# Altium footprint library Project_Vega.PcbLib: 57 footprints (part 3 of 4)
Each footprint in its own frame and in the unit in brackets; x right, y up, seen from the top. Pads: shape width x height; smd on the part's side, far side on the other; paste and mask are expansions set on the pad; w line width, h text height; cw(c..) or ccw(c..) is an arc to the next point about the centre after c.
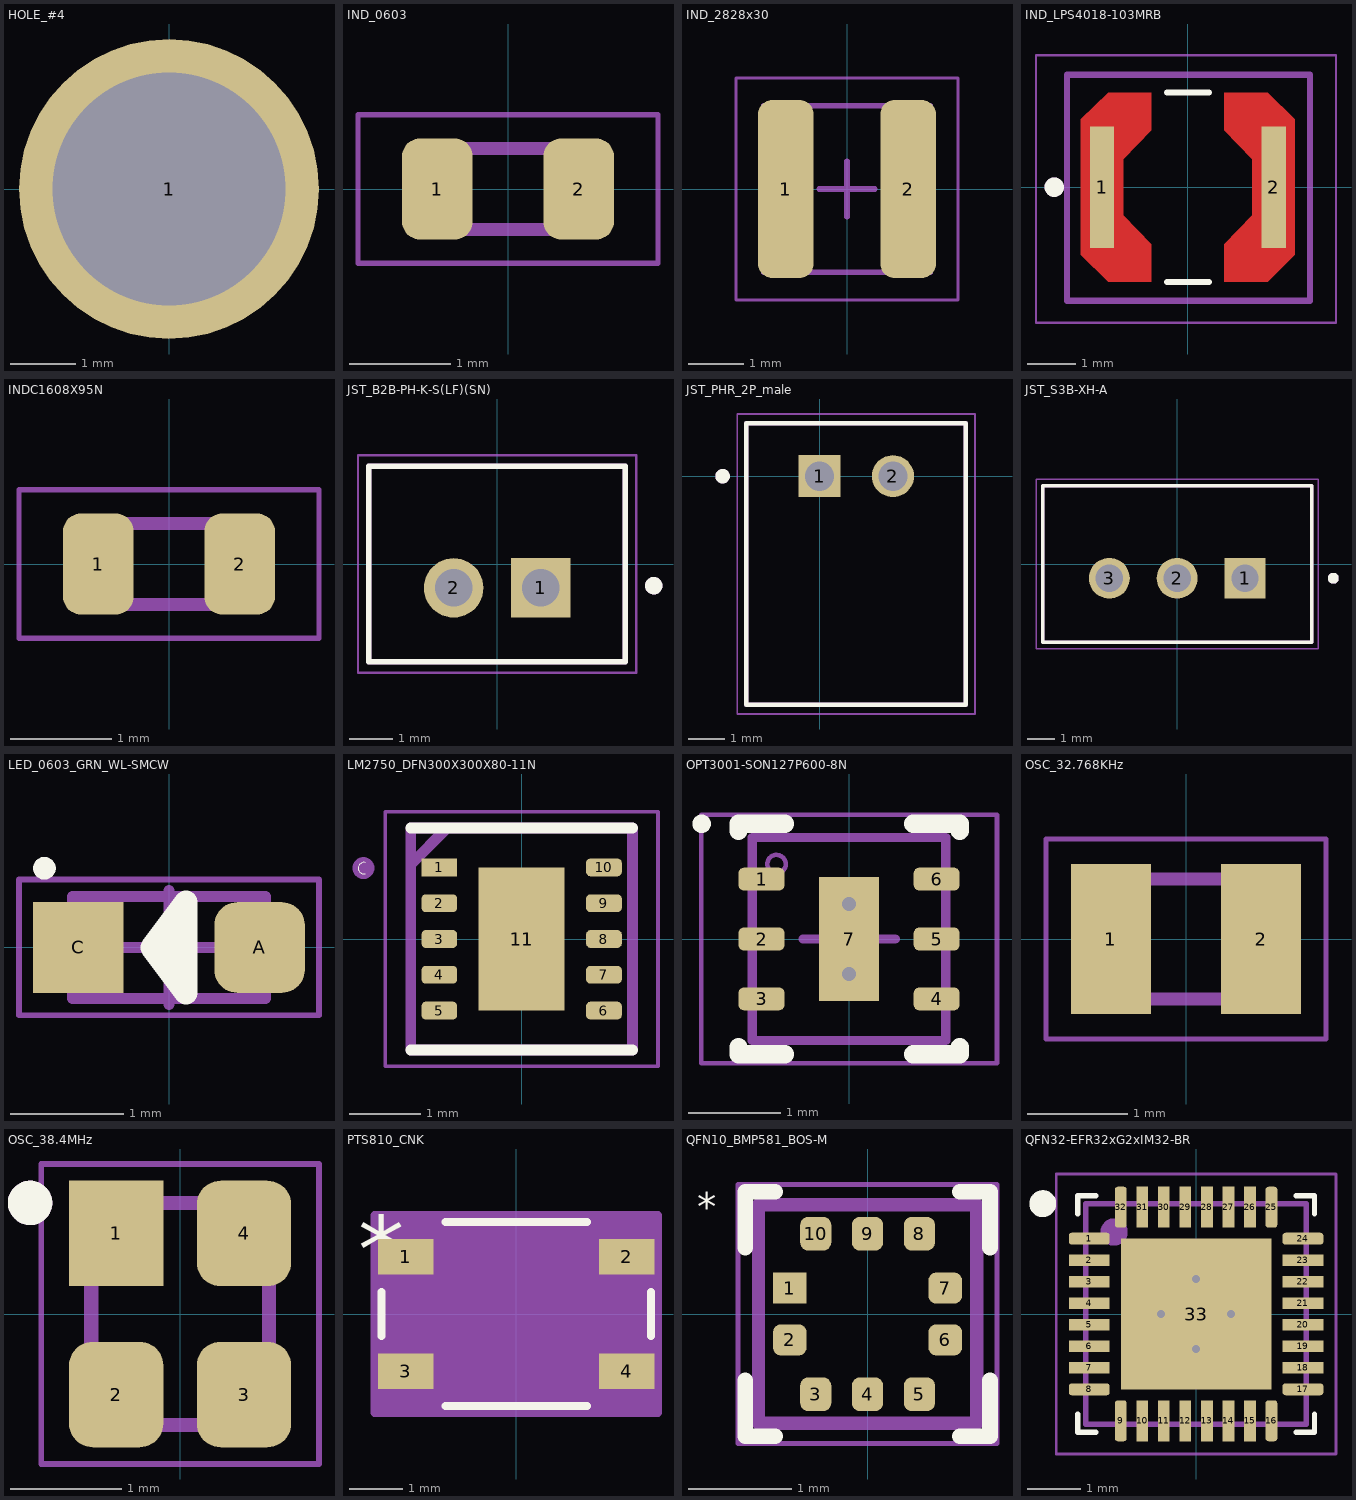
[diagram p2: the footprints below, top view; thin cyan lines are the x and y axes]

## HOLE_#4 [mil]
pads (1):
  round 180 hole 140: 1(0,0)

## IND_0603 [mm] "Inductor Package 0603"
pads (2):
  rrect50% 0.7x1 smd: 1(-0.7,0) 2(0.7,0)
Mechanical 13:
  lines w0.127: -0.8,-0.4 0.8,-0.4 0.8,0.4 -0.8,0.4 -0.8,-0.4
  text ".Designator" at -0.152,-0.339 h0.51
Mechanical 15:
  lines w0.05: -1.485,-0.735 -1.485,0.735 1.485,0.735 1.485,-0.735 -1.485,-0.735
3D body "step_temp.STEP": height 0.95, standoff 0, extent -0.8,-0.4 0.8,0.4

## IND_2828x30 [mm] "Precision Wire Wound Inductor, 2-Leads, Body 2.80x2.80mm, IPC Medium Density"
height 3
pads (2):
  rrect50% 1x3.2 smd: 1(-1.1,0) 2(1.1,0)
Mechanical 13:
  lines w0.1: -1.5,-1.5 1.5,-1.5 1.5,1.5 -1.5,1.5 -1.5,-1.5
  text ".Designator" at -1.12,-1.02 h0.9
Mechanical 15:
  lines w0.05: -2,-2 -2,2 2,2 2,-2 -2,-2
  lines w0.1: -0.5,0 0.5,0 ; 0,-0.5 0,0.5
3D body "744025001_Download_STP_WE-TPC-2828_rev1.stp": height 2.8, standoff 0, extent -1.4,-1.4 1.4,1.4

## IND_LPS4018-103MRB [mm]
height 1.8
pads (2):
  rect 0.5x2.5 smd paste-2 mask+0: 1(-1.765,0) 2(1.765,0)
Top Layer:
  region: -0.75,1.17 -1.33,0.575 -1.33,-0.575 -0.75,-1.17 -0.75,-1.945 -1.64,-1.945 -2.2,-1.395 -2.2,1.395 -1.64,1.945 -0.75,1.945
  region: 2.2,1.395 2.2,-1.395 1.64,-1.945 0.75,-1.945 0.75,-1.17 1.33,-0.575 1.33,0.575 0.75,1.17 0.75,1.945 1.64,1.945
Top Overlay:
  circle w0.2: c-2.75,0 r0.1
  lines w0.127: -0.43,-1.95 0.43,-1.95 ; -0.43,1.95 0.43,1.95
Top Paste:
  region: -0.75,1.17 -1.33,0.575 -1.33,-0.575 -0.75,-1.17 -0.75,-1.945 -1.64,-1.945 -2.2,-1.395 -2.2,1.395 -1.64,1.945 -0.75,1.945
  region: 2.2,1.395 2.2,-1.395 1.64,-1.945 0.75,-1.945 0.75,-1.17 1.33,-0.575 1.33,0.575 0.75,1.17 0.75,1.945 1.64,1.945
Top Solder:
  region: -0.65,1.129 -1.23,0.534 -1.23,-0.534 -0.65,-1.129 -0.65,-2.045 -1.681,-2.045 -2.3,-1.437 -2.3,1.437 -1.681,2.045 -0.65,2.045
  region: 2.3,1.437 2.3,-1.437 1.681,-2.045 0.65,-2.045 0.65,-1.129 1.23,-0.534 1.23,0.534 0.65,1.129 0.65,2.045 1.681,2.045
Mechanical 13:
  circle w0.2: c-2.75,0 r0.1
  lines w0.127: -2.489,-2.337 2.515,-2.337 2.515,2.311 -2.489,2.311 -2.489,-2.337
  text ".Designator" at -0.279,-0.347 h1.02
Mechanical 15:
  lines w0.05: -3.124,-2.794 3.048,-2.794 3.048,2.718 -3.124,2.718 -3.124,-2.794
3D body "LPS4018-103MRC.stp": height 1.81, standoff 0, extent -1.99,-2.032 1.99,1.948

## INDC1608X95N [mm]
pads (2):
  rrect50% 0.7x1 smd: 1(-0.7,0) 2(0.7,0)
Mechanical 13:
  lines w0.127: -0.8,-0.4 -0.8,0.4 0.8,0.4 0.8,-0.4 -0.8,-0.4
  text ".Designator" at -0.584,-0.119 h0.25
Mechanical 15:
  lines w0.05: -1.485,-0.735 1.485,-0.735 1.485,0.735 -1.485,0.735 -1.485,-0.735
3D body "step_temp.STEP": height 0.95, standoff 0, extent -0.8,-0.4 0.8,0.4

## JST_B2B-PH-K-S(LF)(SN) [mm]
pads (2):
  rect 1.368x1.368 / inner round 1.368 / far side rect 1.368x1.368 hole 0.86: 1(1,-0.55)
  round 1.368 hole 0.86: 2(-1,-0.55)
Top Overlay:
  circle w0.2: c3.6,-0.5 r0.1
  lines w0.127: -2.95,-2.25 -2.95,2.25 2.95,2.25 2.95,-2.25 -2.95,-2.25
Mechanical 1:
  text ".Designator" at -2.433,1.066 h0.5
Mechanical 13:
  circle w0.2: c3.6,-0.5 r0.1
  lines w0.127: -2.95,-2.25 2.95,-2.25 2.95,2.25 -2.95,2.25 -2.95,-2.25
Mechanical 15:
  lines w0.05: -3.2,-2.5 3.2,-2.5 3.2,2.5 -3.2,2.5 -3.2,-2.5
3D body "B2B-PH-K-S(LF)(SN)--3DModel-STEP-56544.STEP": height 6.05, standoff -3.35, extent -2.95,-2.25 2.95,2.25

## JST_PHR_2P_male [mm]
height 5.25
pads (2):
  rect 1.15x1.15 / inner round 1.15 / far side rect 1.15x1.15 hole 0.8: 1(0,0)
  round 1.15 hole 0.8: 2(2.007,0)
Top Overlay:
  circle w0.2: c-2.65,0 r0.1
  lines w0.127: -2,-6.25 -2,1.45 4,1.45 4,-6.25 -2,-6.25
Mechanical 13:
  circle w0.2: c-2.65,0 r0.1
  lines w0.127: -2,-6.25 -2,1.45 4,1.45 4,-6.25 -2,-6.25
  text ".Designator" at 0.076,-2.794 h0.76
Mechanical 15:
  lines w0.05: -2.25,-6.5 -2.25,1.7 4.25,1.7 4.25,-6.5 -2.25,-6.5
3D body "440055-2.stp": height 4.96, standoff -3.39, extent -1.936,-6.223 4.064,1.477

## JST_S3B-XH-A [mm]
height 7
pads (3):
  rect 1.508x1.508 / inner round 1.508 / far side rect 1.508x1.508 hole 1: 1(2.5,-0.525)
  round 1.508 hole 1: 2(0,-0.525) 3(-2.5,-0.525)
Top Overlay:
  circle w0.2: c5.75,-0.525 r0.1
  lines w0.127: -4.95,-2.875 -4.95,2.875 4.95,2.875 4.95,-2.875 -4.95,-2.875
Mechanical 1:
  text ".Designator" at -0.762,0.762 h1.52
Mechanical 13:
  circle w0.2: c5.75,-0.525 r0.1
  lines w0.127: -4.95,-2.875 -4.95,2.875 4.95,2.875 4.95,-2.875 -4.95,-2.875
Mechanical 15:
  lines w0.05: -5.2,-3.125 -5.2,3.125 5.2,3.125 5.2,-3.125 -5.2,-3.125
3D body "S3B-XH-A.STEP": height 6.1, standoff -3.4, extent -4.95,-2.92 4.95,8.58

## LED_0603_GRN_WL-SMCW [mm] "SODFL, 2-Leads, Body 0.80x1.80mm, IPC Medium Density"
height 0.8
pads (2):
  rrect50% 0.8x0.8 smd: A(0.8,0)
  rect 0.8x0.8 smd: C(-0.8,0)
Top Overlay:
  circle w0.1: c-1.1,0.7 r0.05
  lines w0.2: -0.15,0 0.05,0
  lines w0.205: -0.15,0 0.15,0.4 0.15,-0.4 -0.15,0
Mechanical 13:
  lines w0.1: -0.85,-0.45 0.85,-0.45 0.85,0.45 -0.85,0.45 -0.85,-0.45
  text ".Designator" at -0.723,-0.254 h0.5
Mechanical 15:
  lines w0.05: -1.325,-0.6 1.325,-0.6 1.325,0.6 -1.325,0.6 -1.325,-0.6
  lines w0.1: -0.5,0 0.5,0 ; 0,-0.5 0,0.5
3D body "LED_0603_WURTH_WL-SMCW_base.step": height 0.65, standoff 0.01, extent -0.8,-0.4 0.8,0.4
3D body "LED_0603_WURTH_WL-SMCW_lens.step": height 0.71, standoff 0.31, extent -0.55,-0.4 0.55,0.4

## LM2750_DFN300X300X80-11N [mm]
pads (11):
  rect 0.5x0.25 smd: 1(-1.15,1)
  rrect50% 0.5x0.25 smd: 2(-1.15,0.5) 3(-1.15,0) 4(-1.15,-0.5) 5(-1.15,-1) 6(1.15,-1) 7(1.15,-0.5) 8(1.15,0) 9(1.15,0.5) 10(1.15,1)
  rect 1.2x2 smd: 11(0,0)
Top Overlay:
  lines w0: -2.184,0.914 cw(c-2.203,0.991) -2.184,1.067
  lines w0.152: -1.549,-1.549 1.549,-1.549 ; -1.549,1.549 1.549,1.549
Mechanical 13:
  lines w0.152: -1.549,1.041 -1.041,1.549 ; -2.286,0.991 ccw(c-2.21,0.991) -2.134,0.991 ccw(c-2.21,0.991) -2.286,0.991 ; -1.549,-1.549 1.549,-1.549 1.549,1.549 -1.549,1.549 -1.549,-1.549
  text ".Designator" at -0.025,0.017 h0.51
Mechanical 15:
  lines w0.05: -1.905,-1.778 1.905,-1.778 1.905,1.778 -1.905,1.778 -1.905,-1.778
3D body "LM2750SD-5.0_NOPB.STEP": height 0.8, standoff 0, extent -1.5,-1.5 1.5,1.5

## OPT3001-SON127P600-8N [mm] "SENSOR OPT 550NM AMBIENT 6 UDFN"
height 0.65
pads (7):
  rrect50% 0.5x0.25 smd mask+0.07: 1(-0.95,0.65) 2(-0.95,0) 3(-0.95,-0.65) 4(0.95,-0.65) 5(0.95,0) 6(0.95,0.65)
  rect 0.65x1.35 smd mask+0.07: 7(0,0)
via 0,0.381 diameter 0.25 hole 0.15
via 0,-0.381 diameter 0.25 hole 0.15
Top Overlay:
  circle w0.1: c-1.6,1.25 r0.05
  lines w0.2: -1.2,-1.175 -1.2,-1.25 -0.695,-1.25 ; -1.2,1.175 -1.2,1.25 -0.695,1.25 ; 0.695,-1.25 1.2,-1.25 1.2,-1.175 ; 0.695,1.25 1.2,1.25 1.2,1.175
Mechanical 13:
  circle w0.05: c-0.787,0.813 r0.1
  lines w0.1: -1.05,-1.1 1.05,-1.1 1.05,1.1 -1.05,1.1 -1.05,-1.1
  text ".Designator" at -0.763,-0.73 h0.25
Mechanical 15:
  lines w0.05: -1.605,-1.35 1.605,-1.35 1.605,1.35 -1.605,1.35 -1.605,-1.35
  lines w0.1: -0.5,0 0.5,0 ; 0,-0.5 0,0.5
3D body: height 0.65, standoff 0.05, extent -1.05,-1.1 1.05,1.1

## OSC_32.768KHz [mm] "Tuning Fork Crystal 32.768kHz in 1.2 x 2.0mm package"
height 0.6
pads (2):
  rect 0.8x1.5 smd: 1(-0.75,0) 2(0.75,0)
Mechanical 13:
  lines w0.127: -1,-0.6 -1,0.6 1,0.6 1,-0.6 -1,-0.6
  text ".Designator" at -0.127,-0.136 h0.51
Mechanical 15:
  lines w0.05: -1.4,-1 -1.4,1 1.4,1 1.4,-1 -1.4,-1
3D body "step_temp.STEP": height 0.6, standoff 0, extent -1,-0.6 1,0.6

## OSC_38.4MHz [mm] "38.4 MHz ±10ppm Crystal 10pF 40 Ohms 4-SMD, No Lead"
height 0.7
pads (4):
  rect 0.85x0.95 smd: 1(-0.575,0.725)
  rrect50% 0.85x0.95 smd: 2(-0.575,-0.725) 3(0.575,-0.725) 4(0.575,0.725)
Top Overlay:
  circle w0.2: c-1.35,1 r0.1
Mechanical 13:
  circle w0.2: c-1.35,1 r0.1
  lines w0.127: -0.8,-1 -0.8,1 0.8,1 0.8,-1 -0.8,-1
  text ".Designator" at 1.024,-0.027 h0.51
Mechanical 15:
  lines w0.05: -1.25,-1.35 -1.25,1.35 1.25,1.35 1.25,-1.35 -1.25,-1.35
3D body "XRCGB38M400F2P00R0.STEP": height 0.7, standoff 0, extent -0.796,-0.995 0.804,1.005

## PTS810_CNK [mm]
pads (4):
  rect 1.041x0.66 smd paste+0 mask+0: 1(-2.075,1.075) 2(2.075,1.075) 3(-2.075,-1.075) 4(2.075,-1.075)
Top Overlay:
  lines w0.152: -2.527,-0.412 -2.527,0.412 ; -1.327,-1.727 1.327,-1.727 ; -1.327,1.727 1.327,1.727 ; 2.527,-0.412 2.527,0.412
  text "*" at -2.972,0.584 h1.27
Mechanical 13:
  lines w0.025: -2.4,-0.8 -2.4,0.8 -1.2,1.6 1.2,1.6 2.4,0.8 2.4,-0.8 1.2,-1.6 -1.2,-1.6 -2.4,-0.8
  text "*" at -1.829,-0.178 h1.27
  text ".Designator" at -1.17,-0.666 h0.75
Mechanical 15:
  region: 2.659,-1.854 -2.659,-1.854 -2.659,1.854 2.659,1.854
  lines w0.152: -2.659,-1.854 -2.659,1.854 2.659,1.854 2.659,-1.854 -2.659,-1.854
3D body "PTS810SJM250SMTRLFS--3DModel-STEP-56544.STEP": height 2.7, standoff 0, extent -2.3,-1.6 2.3,1.6

## QFN10_BMP581_BOS-M [mm]
pads (10):
  rect 0.325x0.3 smd paste+0 mask+0.05: 1(-0.75,0.25)
  rrect50% 0.325x0.3 smd paste+0 mask+0.05: 2(-0.75,-0.25) 6(0.75,-0.25) 7(0.75,0.25)
  rrect50% 0.3x0.325 smd paste+0 mask+0.05: 3(-0.5,-0.775) 4(0,-0.775) 5(0.5,-0.775) 8(0.5,0.775) 9(0,0.775) 10(-0.5,0.775)
Top Overlay:
  lines w0.152: -1.181,-0.643 -1.181,-1.181 -0.893,-1.181 ; -1.181,0.643 -1.181,1.181 -0.893,1.181 ; 0.893,-1.181 1.181,-1.181 1.181,-0.643 ; 0.893,1.181 1.181,1.181 1.181,0.643
  text "*" at -1.646,0.903 h0.27
Mechanical 13:
  lines w0.127: -1.054,-1.054 1.054,-1.054 1.054,1.054 -1.054,1.054 -1.054,-1.054
  text ".Designator" at -0.229,-0.136 h0.51
Mechanical 15:
  lines w0.05: -1.25,-1.25 -1.25,1.25 1.25,1.25 1.25,-1.25 -1.25,-1.25
3D body "QFN10_BMP581_BOS.step": height 0.81, standoff 0, extent -1.054,-1.054 1.054,1.054

## QFN32-EFR32xG2xIM32-BR [mm] "QFN, 32-Leads, Body 4.00x4.00mm, Pitch 0.40mm, Thermal Pad 2.80x2.80mm, IPC Medium Density"
height 0.9
pads (37):
  rrect50% 0.76x0.22 smd mask+0.06: 1(-1.985,1.4) 8(-1.985,-1.4) 17(1.985,-1.4) 24(1.985,1.4)
  rect 0.76x0.22 smd mask+0.06: 2(-1.985,1) 3(-1.985,0.6) 4(-1.985,0.2) 5(-1.985,-0.2) 6(-1.985,-0.6) 7(-1.985,-1) 18(1.985,-1) 19(1.985,-0.6) 20(1.985,-0.2) 21(1.985,0.2) 22(1.985,0.6) 23(1.985,1)
  rrect50% 0.22x0.76 smd mask+0.06: 9(-1.4,-1.985) 16(1.4,-1.985) 25(1.4,1.985) 32(-1.4,1.985)
  rect 0.22x0.76 smd mask+0.06: 10(-1,-1.985) 11(-0.6,-1.985) 12(-0.2,-1.985) 13(0.2,-1.985) 14(0.6,-1.985) 15(1,-1.985) 26(1,1.985) 27(0.6,1.985) 28(0.2,1.985) 29(-0.2,1.985) 30(-0.6,1.985) 31(-1,1.985)
  rect 2.8x2.8 smd paste-1817.05: 33(0,0)
  rect 1.1x1.1 on Top Paste mask+0.06: ""(-0.65,-0.65) ""(-0.65,0.65) ""(0.65,-0.65) ""(0.65,0.65)
via 0.65,0 diameter 0.254 hole 0.152
via 0,-0.65 diameter 0.254 hole 0.152
via -0.65,0 diameter 0.254 hole 0.152
via 0,0.65 diameter 0.254 hole 0.152
Top Overlay:
  circle w0.25: c-2.85,2.05 r0.125
  lines w0.1: -2.2,-1.86 -2.2,-2.2 -1.86,-2.2 ; -2.2,1.86 -2.2,2.2 -1.86,2.2 ; 1.86,-2.2 2.2,-2.2 2.2,-1.86 ; 1.86,2.2 2.2,2.2 2.2,1.86
Mechanical 13:
  circle w0.254: c-1.524,1.524 r0.127
  lines w0.1: -2.05,-2.05 -2.05,2.05 2.05,2.05 2.05,-2.05 -2.05,-2.05
  text ".Designator" at -1.785,-1.568 h0.65
Mechanical 15:
  lines w0.05: -2.6,-2.6 -2.6,2.6 2.6,2.6 2.6,-2.6 -2.6,-2.6
  lines w0.1: -0.5,0 0.5,0 ; 0,-0.5 0,0.5
3D body "QFN32-EFR32BG21A010F1024IM32-BR.step": height 0.9, standoff 0, extent -2.051,-2.051 2.051,2.051